# Altium footprint library aiskylab-01Resistors.PcbLib: 208 footprints (part 6 of 13)
Each footprint in its own frame and in the unit in brackets; x right, y up, seen from the top. Pads: shape width x height; smd on the part's side, far side on the other; paste and mask are expansions set on the pad; w line width, h text height; cw(c..) or ccw(c..) is an arc to the next point about the centre after c.
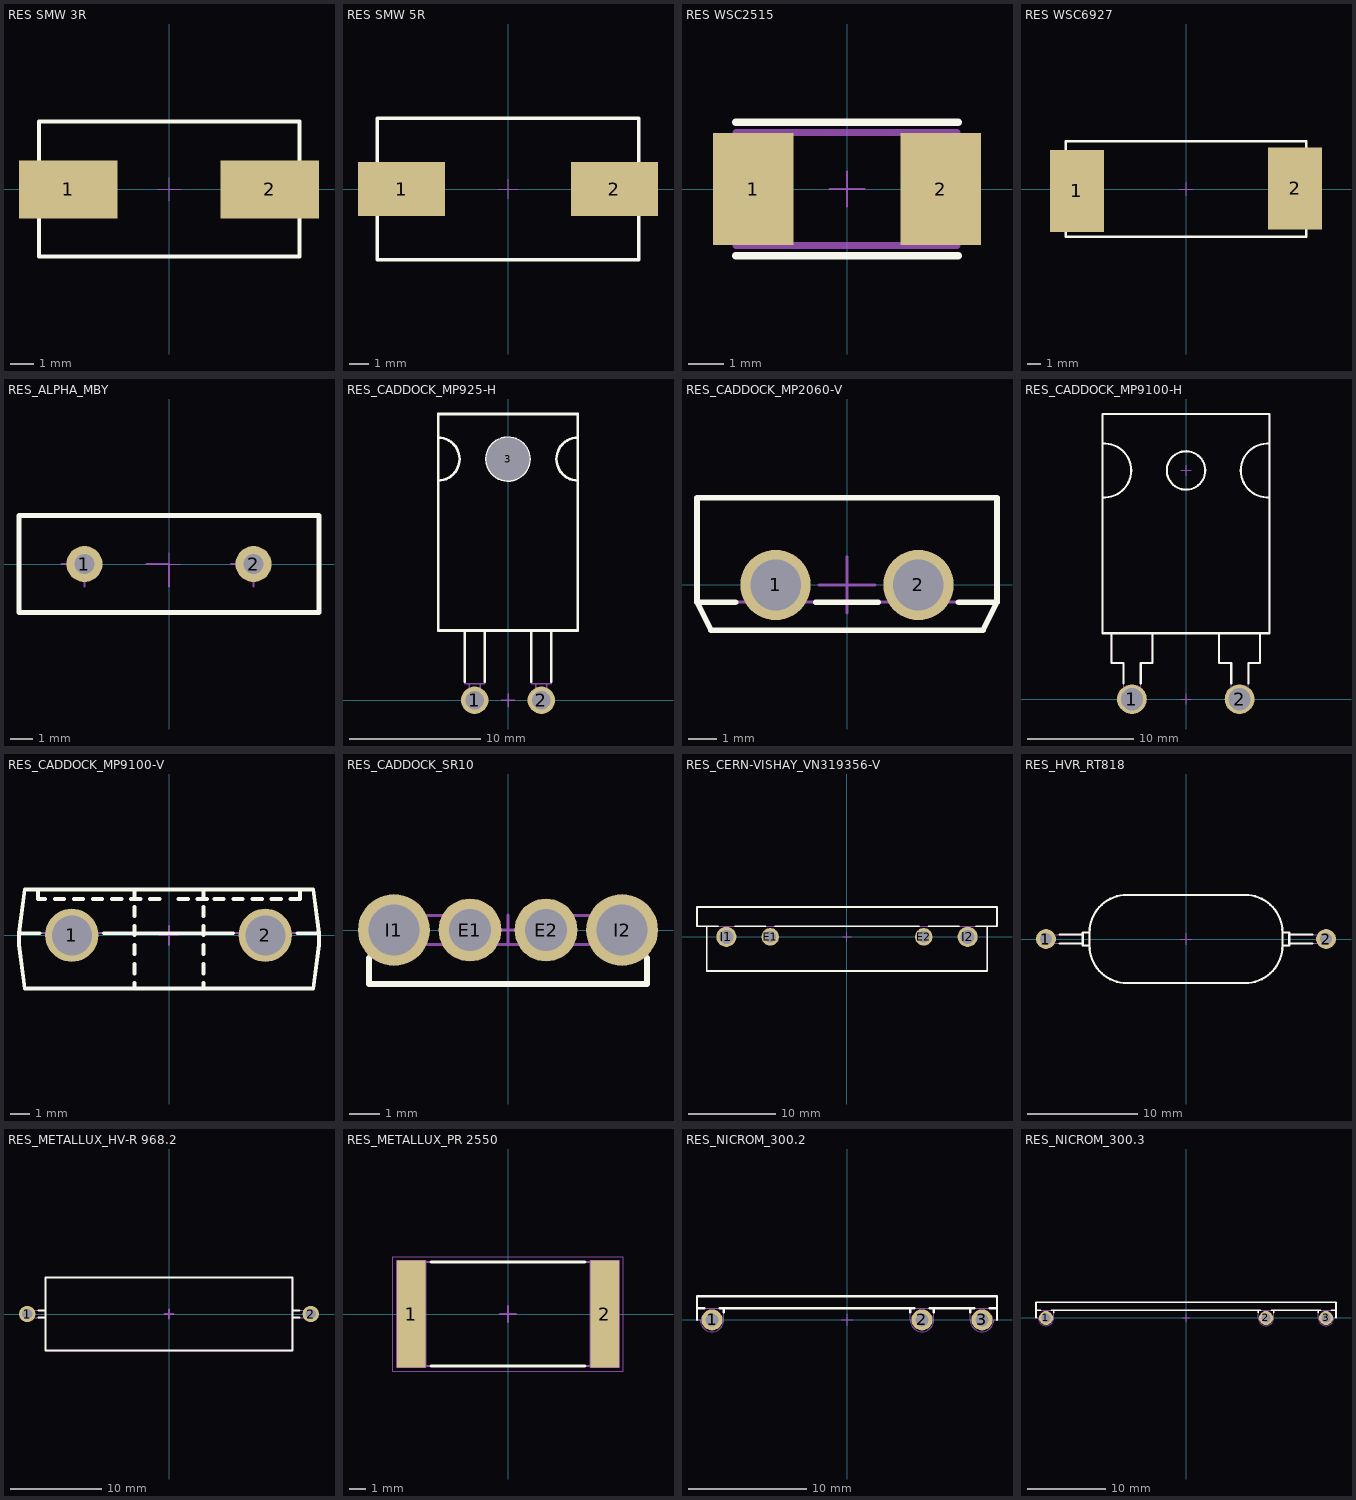
[diagram p5: the footprints below, top view; thin cyan lines are the x and y axes]

## RES SMW 3R [mm]
height 2.2
pads (2):
  rect 4.25x2.5 smd mask+0.07: 1(-4.35,0)
  rect 4.25x2.5 smd: 2(4.35,0)
Top Overlay:
  lines w0.178: -5.613,-2.896 5.626,-2.896 5.626,2.921 -5.613,2.921 -5.613,-2.896
Top Designator:
  text ".Designator" at -7.602,-0.495 h1.52
Top Component Center:
  lines w0.05: -0.5,0 0.5,0 ; 0,-0.5 0,0.5
3D body "p425-250.stp": height 0.02, standoff 0, extent -6.475,-1.25 -2.225,1.25
3D body "p425-250.stp": height 0.02, standoff 0, extent 2.225,-1.25 6.475,1.25
3D body "res-sm-3w.stp": height 5, standoff 0, extent -5.45,-2.75 5.45,2.75

## RES SMW 5R [mm]
height 2.2
pads (2):
  rect 4.5x2.8 smd: 1(-5.5,0)
  rect 4.5x2.8 smd mask+0.07: 2(5.5,0)
Top Overlay:
  lines w0.178: -6.75,-3.65 6.75,-3.65 6.75,3.65 -6.75,3.65 -6.75,-3.65
Top Designator:
  text ".Designator" at -7.633,-0.508 h1.52
Top Component Center:
  lines w0.05: -0.5,0 0.5,0 ; 0,-0.5 0,0.5
3D body "p450-280.stp": height 0.02, standoff 0, extent 3.275,-1.4 7.775,1.4
3D body "p450-280.stp": height 0.02, standoff 0, extent -7.8,-1.4 -3.3,1.4
3D body "ressmw05.stp": height 6.8, standoff -0.3, extent -7.255,-3.429 7.061,3.371

## RES WSC2515 [mm]
height 2.2
pads (2):
  rect 2.29x3.2 smd: 1(-2.67,0)
  rect 2.29x3.2 smd mask+0.07: 2(2.67,0)
Top Overlay:
  lines w0.2: -3.175,-1.9 3.175,-1.9 ; -3.175,1.9 3.175,1.9
Top Designator:
  text ".Designator" at -7.633,-0.508 h1.52
Top Component Center:
  lines w0.05: -0.5,0 0.5,0 ; 0,-0.5 0,0.5
Bottom 3D Body:
  lines w0.2: -3.162,-1.613 3.137,-1.613 3.137,1.613 -3.162,1.613 -3.162,-1.613
3D body "2_92-2_29.stp": height 0.02, standoff 0, extent 1.522,-1.333 3.812,1.587
3D body "2_92-2_29.stp": height 0.02, standoff 0, extent -3.812,-1.32 -1.522,1.6
3D body "2_92-2_29.stp": height 0.02, standoff 0, extent 1.522,-1.612 3.812,1.308
3D body "2_92-2_29.stp": height 0.02, standoff 0, extent -3.825,-1.6 -1.535,1.321
3D body "res6332_2515.stp": height 0.6, standoff 0, extent -3.15,-1.613 3.15,1.587

## RES WSC6927 [mm]
height 2.2
pads (2):
  rect 3.94x5.97 smd: 1(-7.94,-0.14)
  rect 3.94x5.97 smd mask+0.07: 2(7.94,0.038)
Top Overlay:
  lines w0.178: -8.765,-3.49 8.765,-3.49 8.765,3.49 -8.765,3.49 -8.765,-3.49
Top Designator:
  text ".Designator" at -7.633,-0.508 h1.52
Top Component Center:
  lines w0.05: -0.5,0 0.5,0 ; 0,-0.5 0,0.5
3D body "p597-394.stp": height 0.02, standoff 0, extent 5.98,-2.935 9.92,3.035
3D body "p597-394.stp": height 0.02, standoff 0, extent -9.895,-3.135 -5.955,2.835

## RES_ALPHA_MBY [mm] "Resistor, Radial, Pad spacing 7.5mm - Body 13.3mm X 4.3mm X 10.3mm H"
height 10.3
pads (2):
  round 1.6 hole 0.9: 1(-3.75,0) 2(3.75,0)
Top Overlay:
  lines w0.2: -6.65,-2.15 6.65,-2.15 6.65,2.15 -6.65,2.15 -6.65,-2.15
Top Designator:
  text ".Designator" at -7.618,-0.508 h1.52
Top Component Center:
  lines w0.05: -0.5,0 0.5,0 ; 0,-0.5 0,0.5
Top Dimensions:
  lines w0.1: -4.75,0 -3.75,0 -3.75,-1 ; -1,0 0,0 0,-1 ; 2.75,0 3.75,0 3.75,-1
Top 3D Body:
  lines w0.1: -6.65,-2.15 -6.65,2.15 6.65,2.15 6.65,-2.15 -6.65,-2.15
3D body "v160-090.stp": height 0.02, standoff -1.65, extent 2.95,-0.8 4.55,0.8
3D body "v160-090.stp": height 0.02, standoff -1.65, extent -4.55,-0.8 -2.95,0.8
3D body "RES_ALPHA_MBY.stp": height 10.3, standoff -3.1, extent -6.65,-2.15 6.65,2.15

## RES_CADDOCK_MP925-H [mm] "CADDOCK MP925 Serie TO-220 Style, Power Film Resistors"
height 3.44
pads (3):
  round 2.1 hole 1.4: 1(-2.54,0) 2(2.54,0)
  round 1 hole 3.3 unplated: 3(0,18.4)
Top Overlay:
  circle w0.2: c0,18.4 r1.64
  lines w0.2: -5.335,16.76 ccw(c-5.335,18.4) -5.335,20.04 ; -3.305,1.4 -3.305,5.32 -1.775,5.32 -1.775,1.4 ; -0.765,5.32 0.765,5.32 ; 1.775,1.4 1.775,5.32 3.305,5.32 3.305,1.4 ; 5.335,16.76 cw(c5.335,18.4) 5.335,20.04 ; -5.335,5.32 5.335,5.32 5.335,21.84 -5.335,21.84 -5.335,5.32
Top Designator:
  text ".Designator" at -7.618,9.886 h1.52
Top Assembly:
  lines w0.1: -2.97,1.26 -2.97,-0.37 -2.11,-0.37 -2.11,1.26 ; -0.765,5.32 0.765,5.32 ; 2.11,1.26 2.11,-0.37 2.97,-0.37 2.97,1.26 ; -5.335,5.32 -5.335,21.84 5.335,21.84 5.335,5.32 -5.335,5.32 ; -3.305,1.26 -3.305,5.32 -1.775,5.32 -1.775,1.26 -3.305,1.26 ; 1.775,1.26 1.775,5.32 3.305,5.32 3.305,1.26 1.775,1.26
Top Component Center:
  lines w0.1: -3.04,0 -2.54,0 ; -2.54,-0.5 -2.54,0 ; -2.54,0.5 -2.54,0 ; -2.04,0 -2.54,0 ; -0.5,0 0,0 ; -0.5,18.4 0,18.4 ; 0,-0.5 0,0 ; 0,0.5 0,0 ; 0,17.9 0,18.4 ; 0,18.9 0,18.4 ; 0.5,0 0,0 ; 0.5,18.4 0,18.4 ; 2.04,0 2.54,0 ; 2.54,-0.5 2.54,0 ; 2.54,0.5 2.54,0 ; 3.04,0 2.54,0
3D body "RES_CADDOCK_MP925_H.stp": height 3.44, standoff -3.6, extent -5.335,-0.37 5.335,21.84
3D body "v200-130.stp": height 0.02, standoff -1.65, extent 1.54,-1 3.54,1
3D body "v200-130.stp": height 0.02, standoff -1.65, extent -3.55,-1.075 -1.55,0.925

## RES_CADDOCK_MP2060-V [mm] "CADDOCK MP3060 Serie, Radial Power Clip Mount Resistor, Pad spacing 5.08mm"
height 21.09
pads (2):
  round 2.5 hole 1.8: 1(-2.54,0) 2(2.54,0)
Top Overlay:
  lines w0.2: -3.965,-0.61 -5.335,-0.61 ; -1.115,-0.61 1.115,-0.61 ; 3.965,-0.61 5.335,-0.61 ; -5.335,-0.61 -4.835,-1.61 4.835,-1.61 5.335,-0.61 ; -5.335,-0.61 -5.335,3.1 5.335,3.1 5.335,-0.61
Top Designator:
  text ".Designator" at -7.618,0.237 h1.52
Top Component Center:
  lines w0.05: -0.5,0 0.5,0 ; 0,-0.5 0,0.5
Top Dimensions:
  lines w0.1: -3.54,0 -2.54,0 ; -2.54,-1 -2.54,0 ; -2.54,1 -2.54,0 ; -1.54,0 -2.54,0 ; -1,0 0,0 ; 0,-1 0,0 ; 0,1 0,0 ; 1,0 0,0 ; 1.54,0 2.54,0 ; 2.54,-1 2.54,0 ; 2.54,1 2.54,0 ; 3.54,0 2.54,0
Top 3D Body:
  lines w0.1: -5.335,-0.61 -4.835,-1.61 4.835,-1.61 5.335,-0.61 ; -5.335,-0.61 -5.335,3.1 5.335,3.1 5.335,-0.61 ; -5.335,-0.61 5.335,-0.61
3D body "v200-130.stp": height 0.02, standoff -1.65, extent 1.54,-1 3.54,1
3D body "v200-130.stp": height 0.02, standoff -1.65, extent -3.54,-1 -1.54,1
3D body "RES_CADDOCK_MP2060.stp": height 21.72, standoff -3.4, extent -5.335,-1.61 5.335,3.1

## RES_CADDOCK_MP9100-H [mm] "CADDOCK MP9100 Serie TO-247 Style, Power Film Resistors"
height 5.21
pads (2):
  round 2.8 hole 2.1: 1(-5.105,0) 2(5.055,0)
Top Overlay:
  circle w0.2: c0,21.59 r1.815
  lines w0.2: -7.875,19.055 ccw(c-7.71,21.59) -7.875,24.125 ; -7.035,6.22 -7.035,3.43 -5.89,3.43 -5.89,1.5 ; -4.27,1.5 -4.27,3.43 -3.175,3.43 -3.175,6.22 ; 3.125,6.22 3.125,3.43 4.27,3.43 4.27,1.5 ; 5.89,1.5 5.89,3.43 6.985,3.43 6.985,6.22 ; 7.875,19.055 cw(c7.71,21.59) 7.875,24.125 ; -7.875,6.22 7.875,6.22 7.875,26.92 -7.875,26.92 -7.875,6.22
Top Designator:
  text ".Designator" at -7.618,12.251 h1.52
Bottom Designator:
  lines w0.1: -5.89,-0.455 -4.27,-0.455 ; 4.27,-0.455 5.89,-0.455
Top Component Center:
  lines w0.05: -0.5,0 0.5,0 ; 0,-0.5 0,0.5
  lines w0.1: -5.58,0 -5.08,0 ; -5.08,-0.5 -5.08,0 ; -5.08,0.5 -5.08,0 ; -4.58,0 -5.08,0 ; -0.5,0 0,0 ; -0.5,21.59 0,21.59 ; 0,-0.5 0,0 ; 0,0.5 0,0 ; 0,21.09 0,21.59 ; 0,22.09 0,21.59 ; 0.5,0 0,0 ; 0.5,21.59 0,21.59 ; 4.58,0 5.08,0 ; 5.08,-0.5 5.08,0 ; 5.08,0.5 5.08,0 ; 5.58,0 5.08,0
Top 3D Body:
  circle w0.1: c0,21.59 r1.815
  lines w0.1: -7.875,19.055 ccw(c-7.71,21.59) -7.875,24.125 ; -7.035,6.22 -7.035,3.43 -5.89,3.43 -5.89,-0.455 ; -4.27,-0.455 -4.27,3.43 -3.175,3.43 -3.175,6.22 ; 3.125,6.22 3.125,3.43 4.27,3.43 4.27,-0.455 ; 5.89,-0.455 5.89,3.43 6.985,3.43 6.985,6.22 ; 7.875,19.055 cw(c7.71,21.59) 7.875,24.125 ; -7.875,6.22 7.875,6.22 7.875,26.92 -7.875,26.92 -7.875,6.22
3D body "v200-130.stp": height 0.02, standoff -1.65, extent -6.105,-1 -4.105,1
3D body "v200-130.stp": height 0.02, standoff -1.65, extent 4.055,-1 6.055,1
3D body "RES_CADDOCK_MP9100_H.stp": height 5.21, standoff -3.8, extent -7.875,-0.455 7.875,26.92

## RES_CADDOCK_MP9100-V [mm] "CADDOCK MP9100 Serie TO-247 Style, Power Film Resistors"
height 27.3
pads (2):
  round 2.8 hole 2.1: 1(-5.105,0) 2(5.055,0)
Top Overlay:
  lines w0.2: -6.875,2.41 -6.875,1.91 -6.5,1.91 ; -6.801,0.11 -7.875,0.11 ; -6,1.91 -5.5,1.91 ; -5,1.91 -4.5,1.91 ; -4,1.91 -3.5,1.91 ; -3.409,0.11 3.359,0.11 ; -3,1.91 -2.5,1.91 ; -2,1.91 -1.5,1.91 ; -1.815,-2.8 -1.815,-2.5 ; -1.815,-2 -1.815,-1.5 ; -1.815,-1 -1.815,-0.5 ; -1.815,0 -1.815,0.5 ; -1.815,1 -1.815,1.5 ; -1.815,2 -1.815,2.41 ; -1,1.91 -0.5,1.91 ; 0.5,1.91 1,1.91 ; 1.5,1.91 2,1.91 ; 1.815,-2.8 1.815,-2.5 ; 1.815,-2 1.815,-1.5 ; 1.815,-1 1.815,-0.5 ; 1.815,0 1.815,0.5 ; 1.815,1 1.815,1.5 ; 1.815,2 1.815,2.41 ; 2.375,1.91 2.875,1.91 ; 3.375,1.91 3.875,1.91 ; 4.375,1.91 4.875,1.91 ; 5.375,1.91 5.875,1.91 ; 6.375,1.91 6.875,1.91 6.875,2.41 ; 6.751,0.11 7.875,0.11 ; -7.875,0.11 -7.575,2.41 7.575,2.41 7.875,0.11 ; -7.875,0.11 -7.875,-0.5 -7.575,-2.8 7.575,-2.8 7.875,-0.5 7.875,0.11
Top Designator:
  text ".Designator" at -7.618,-0.703 h1.52
Top Assembly:
  lines w0.1: -6.875,2.41 -6.875,1.91 -6.5,1.91 ; -6,1.91 -5.5,1.91 ; -5,1.91 -4.5,1.91 ; -4,1.91 -3.5,1.91 ; -3,1.91 -2.5,1.91 ; -2,1.91 -1.5,1.91 ; -1.815,-2.8 -1.815,-2.5 ; -1.815,-2 -1.815,-1.5 ; -1.815,-1 -1.815,-0.5 ; -1.815,0 -1.815,0.5 ; -1.815,1 -1.815,1.5 ; -1.815,2 -1.815,2.41 ; -1,1.91 -0.5,1.91 ; 0.5,1.91 1,1.91 ; 1.5,1.91 2,1.91 ; 1.815,-2.8 1.815,-2.5 ; 1.815,-2 1.815,-1.5 ; 1.815,-1 1.815,-0.5 ; 1.815,0 1.815,0.5 ; 1.815,1 1.815,1.5 ; 1.815,2 1.815,2.41 ; 2.375,1.91 2.875,1.91 ; 3.375,1.91 3.875,1.91 ; 4.375,1.91 4.875,1.91 ; 5.375,1.91 5.875,1.91 ; 6.375,1.91 6.875,1.91 6.875,2.41 ; -7.875,0.11 7.875,0.11 ; -7.875,0.11 -7.575,2.41 7.575,2.41 7.875,0.11 ; -7.875,0.11 -7.875,-0.5 -7.575,-2.8 7.575,-2.8 7.875,-0.5 7.875,0.11
Top Component Center:
  lines w0.1: -5.605,0 -5.105,0 ; -5.105,-0.5 -5.105,0 ; -5.105,0.5 -5.105,0 ; -4.605,0 -5.105,0 ; -0.5,0 0,0 ; 0,-0.5 0,0 ; 0,0.5 0,0 ; 0.5,0 0,0 ; 4.555,0 5.055,0 ; 5.055,-0.5 5.055,0 ; 5.055,0.5 5.055,0 ; 5.555,0 5.055,0
3D body "v200-130.stp": height 0.02, standoff -1.65, extent 4.055,-1 6.055,1
3D body "RES_CADDOCK_MP9100_V.stp": height 27.33, standoff -3.8, extent -7.875,-2.8 7.875,2.41
3D body "v200-130.stp": height 0.02, standoff -1.65, extent -6.105,-1 -4.105,1
3D body "v200-130.stp": height 0.02, standoff -1.65, extent 4.055,-1 6.055,1

## RES_CADDOCK_SR10 [mm] "Precision Current Sense Resistor"
height 9.78
pads (4):
  round 2.1 hole 1.4: E1(-1.27,0) E2(1.27,0)
  round 2.4 hole 1.7: I1(-3.81,0) I2(3.81,0)
Top Overlay:
  lines w0.2: -4.635,-0.939 -4.635,-1.8 4.635,-1.8 4.635,-0.939
Top Designator:
  text ".Designator" at -7.618,-0.807 h1.52
Top Assembly:
  lines w0.1: -4.38,-0.49 -4.38,0.49 -0.95,0.49 -0.95,-0.49 ; 0.95,-0.49 0.95,0.49 4.38,0.49 4.38,-0.49 ; -4.635,-1.8 4.635,-1.8 4.635,-0.49 -4.635,-0.49 -4.635,-1.8
Top Component Center:
  lines w0.1: -4.31,0 -3.81,0 ; -3.81,-0.5 -3.81,0 ; -3.81,0.5 -3.81,0 ; -3.31,0 -3.81,0 ; -1.77,0 -1.27,0 ; -1.27,-0.5 -1.27,0 ; -1.27,0.5 -1.27,0 ; -0.77,0 -1.27,0 ; -0.5,0 0,0 ; 0,-0.5 0,0 ; 0,0.5 0,0 ; 0.5,0 0,0 ; 0.77,0 1.27,0 ; 1.27,-0.5 1.27,0 ; 1.27,0.5 1.27,0 ; 1.77,0 1.27,0 ; 3.31,0 3.81,0 ; 3.81,-0.5 3.81,0 ; 3.81,0.5 3.81,0 ; 4.31,0 3.81,0
3D body "RES_CADDOCK_SR10.stp": height 9.87, standoff -3.6, extent -4.635,-1.8 4.635,0.49
3D body "v200-130.stp": height 0.02, standoff -1.65, extent 2.81,-1 4.81,1
3D body "v200-130.stp": height 0.02, standoff -1.65, extent 0.27,-1 2.27,1
3D body "v200-130.stp": height 0.02, standoff -1.65, extent -2.27,-1 -0.27,1
3D body "v200-130.stp": height 0.02, standoff -1.65, extent -4.81,-1 -2.81,1

## RES_CERN-VISHAY_VN319356-V [mm] "Custom Made Product VISHAY High Stability Precision Shunt Resistor"
height 25.2
pads (4):
  round 2 hole 1.3: E1(-8.75,0) E2(8.75,0)
  round 2.3 hole 1.6: I1(-13.75,0) I2(13.75,0)
Top Overlay:
  lines w0.2: -16,1.2 -16,-3.9 16,-3.9 16,1.2 ; -14.7,1.2 -17.1,1.2 -17.1,3.4 17.1,3.4 17.1,1.2 14.7,1.2 ; -12.8,1.2 -9.25,1.2 ; -8.25,1.2 8.25,1.2 ; 9.25,1.2 12.8,1.2
Top Designator:
  text ".Designator" at -7.617,-0.758 h1.52
Top Assembly:
  lines w0.1: -17.1,1.2 17.1,1.2 17.1,3.4 -17.1,3.4 -17.1,1.2 ; -16,-3.9 16,-3.9 16,1.2 -16,1.2 -16,-3.9
Top Component Center:
  lines w0.1: -14.25,0 -13.75,0 ; -13.75,-0.5 -13.75,0 ; -13.75,0.5 -13.75,0 ; -13.25,0 -13.75,0 ; -9.25,0 -8.75,0 ; -8.75,-0.5 -8.75,0 ; -8.75,0.5 -8.75,0 ; -8.25,0 -8.75,0 ; -0.5,0 0,0 ; 0,-0.5 0,0 ; 0,0.5 0,0 ; 0.5,0 0,0 ; 8.25,0 8.75,0 ; 8.75,-0.5 8.75,0 ; 8.75,0.5 8.75,0 ; 9.25,0 8.75,0 ; 13.25,0 13.75,0 ; 13.75,-0.5 13.75,0 ; 13.75,0.5 13.75,0 ; 14.25,0 13.75,0
3D body "RES_CERN-VISHAY_VN319356-v.stp": height 25.2, standoff -3.8, extent -17.1,-3.9 17.1,3.4
3D body "v200-130.stp": height 0.02, standoff -1.65, extent -14.75,-1 -12.75,1
3D body "v200-130.stp": height 0.02, standoff -1.65, extent -9.75,-1 -7.75,1
3D body "v200-130.stp": height 0.02, standoff -1.65, extent 7.75,-1 9.75,1
3D body "v200-130.stp": height 0.02, standoff -1.65, extent 12.75,-1 14.75,1

## RES_HVR_RT818 [mm] "Resistor, Axial, Pad spacing 25.4mm - Body L 18.5mm X D 8mm Lead Diameter 0.812mm"
height 8
pads (2):
  round 1.8 hole 1.1: 1(-12.7,0) 2(12.7,0)
Top Overlay:
  lines w0.2: -11.465,-0.406 -9.365,-0.406 ; -11.465,0.406 -9.365,0.406 ; 9.365,-0.406 11.465,-0.406 ; 9.365,0.406 11.465,0.406 ; -8.75,-0.6 ccw(c-5.35,-0.6) -5.35,-4 5.35,-4 ccw(c5.35,-0.6) 8.75,-0.6 ; -8.75,-0.6 -8.75,0.6 ; -8.75,-0.6 -9.365,-0.6 -9.365,0.6 -8.75,0.6 ; -8.75,0.6 cw(c-5.35,0.6) -5.35,4 5.35,4 cw(c5.35,0.6) 8.75,0.6 ; 8.75,-0.6 8.75,0.6 ; 8.75,-0.6 9.365,-0.6 9.365,0.6 8.75,0.6
Top Designator:
  text ".Designator" at -7.618,-0.508 h1.52
Top Assembly:
  lines w0.1: -9.365,-0.406 -12.7,-0.406 cw(c-12.7,0) -12.7,0.406 -9.365,0.406 ; 9.365,-0.406 12.7,-0.406 ccw(c12.7,0) 12.7,0.406 9.365,0.406 ; -8.75,-0.6 ccw(c-5.35,-0.6) -5.35,-4 5.35,-4 ccw(c5.35,-0.6) 8.75,-0.6 ; -8.75,-0.6 -8.75,0.6 ; -8.75,-0.6 -9.365,-0.6 -9.365,0.6 -8.75,0.6 ; -8.75,0.6 cw(c-5.35,0.6) -5.35,4 5.35,4 cw(c5.35,0.6) 8.75,0.6 ; 8.75,-0.6 8.75,0.6 ; 8.75,-0.6 9.365,-0.6 9.365,0.6 8.75,0.6
Top Component Center:
  lines w0.1: -13.2,0 -12.7,0 ; -12.7,-0.5 -12.7,0 ; -12.7,0.5 -12.7,0 ; -12.2,0 -12.7,0 ; -0.5,0 0,0 ; 0,-0.5 0,0 ; 0,0.5 0,0 ; 0.5,0 0,0 ; 12.2,0 12.7,0 ; 12.7,-0.5 12.7,0 ; 12.7,0.5 12.7,0 ; 13.2,0 12.7,0
3D body "v200-130.stp": height 0.02, standoff -1.65, extent 11.7,-1 13.7,1
3D body "v200-130.stp": height 0.02, standoff -1.65, extent -13.7,-1 -11.7,1
3D body "RES_HVR_RT818.stp": height 8, standoff -3.6, extent -13.106,-4 13.106,4

## RES_METALLUX_HV-R 968.2 [mm] "Resistor, Axial, Pad Spacing 31mm - Body Lengh 27mm X Body Diameter 8mm"
height 8
pads (2):
  round 1.8 hole 1.1: 1(-15.5,0) 2(15.5,0)
Top Overlay:
  lines w0.2: -14.275,-0.4 -13.5,-0.4 ; -14.275,0.4 -13.5,0.4 ; 13.5,-0.4 14.275,-0.4 ; 13.5,0.4 14.275,0.4 ; -13.5,-4 -13.5,4 13.5,4 13.5,-4 -13.5,-4
Top Designator:
  text ".Designator" at -7.618,-0.508 h1.52
Top Assembly:
  lines w0.1: -13.5,-0.4 -15.5,-0.4 cw(c-15.5,0) -15.5,0.4 -13.5,0.4 ; 13.5,-0.4 15.5,-0.4 ccw(c15.5,0) 15.5,0.4 13.5,0.4 ; -13.5,-4 -13.5,4 13.5,4 13.5,-4 -13.5,-4
Top Dimensions:
  lines w0.2: -16,0 -15.5,0 ; -15.5,-0.5 -15.5,0 ; -15.5,0.5 -15.5,0 ; -15,0 -15.5,0 ; -0.5,0 0,0 ; 0,-0.5 0,0 ; 0,0.5 0,0 ; 0.5,0 0,0 ; 15,0 15.5,0 ; 15.5,-0.5 15.5,0 ; 15.5,0.5 15.5,0 ; 16,0 15.5,0
3D body "RES_METALLUX_HV-R 968.2.stp": height 8, standoff -3.6, extent -15.9,-4 15.9,4
3D body "v200-130.stp": height 0.02, standoff -1.65, extent 14.5,-1 16.5,1
3D body "v200-130.stp": height 0.02, standoff -1.65, extent -16.5,-1 -14.5,1

## RES_METALLUX_PR 2550 [mm] "High Voltage Resistor SMD Resistor, 2-Leads, Body 12.7 x 6.35 mm, IPC Medium Density"
height 1.52
pads (2):
  rect 1.75x6.5 smd: 1(-5.9,0) 2(5.9,0)
Top Overlay:
  lines w0.2: -4.68,-3.175 4.68,-3.175 ; -4.68,3.175 4.68,3.175
Top Designator:
  text ".Designator" at -7.618,-0.508 h1.52
Top Assembly:
  lines w0.1: -6.35,-3.175 -6.35,3.175 ; -6.35,-3.175 -6.35,3.175 ; -6.35,-3.175 -5.08,-3.175 -5.08,3.175 -6.35,3.175 ; -6.35,-3.175 6.35,-3.175 ; -6.35,3.175 6.35,3.175 ; 6.35,-3.175 6.35,3.175 ; 6.35,-3.175 6.35,3.175 ; 6.35,-3.175 5.08,-3.175 5.08,3.175 6.35,3.175
Top Dimensions:
  lines w0.1: -6.4,0 -5.9,0 ; -5.9,-0.5 -5.9,0 ; -5.9,0.5 -5.9,0 ; -5.4,0 -5.9,0 ; -0.5,0 0,0 ; 0,-0.5 0,0 ; 0,0.5 0,0 ; 0.5,0 0,0 ; 5.4,0 5.9,0 ; 5.9,-0.5 5.9,0 ; 5.9,0.5 5.9,0 ; 6.4,0 5.9,0 ; -6.775,-3.25 -5.025,-3.25 -5.025,3.25 -6.775,3.25 -6.775,-3.25 ; 5.025,-3.25 6.775,-3.25 6.775,3.25 5.025,3.25 5.025,-3.25
Bottom 3D Body:
  lines w0.05: -7.025,-3.5 -7.025,3.5 7.025,3.5 7.025,-3.5 -7.025,-3.5
3D body "RES_METALLUX_PR 2550.stp": height 1.52, standoff 0, extent -6.35,-3.175 6.35,3.175
3D body "p650-175.stp": height 0.02, standoff 0, extent -6.8,-3.25 -5.05,3.25
3D body "p650-175.stp": height 0.02, standoff 0, extent 5.05,-3.25 6.8,3.25

## RES_NICROM_300.2 [mm] "High Voltage Divider NICROM 300.2"
height 7.62
pads (3):
  round 1.8 hole 1.1: 1(-11.43,0) 2(6.35,0) 3(11.43,0)
Top Overlay:
  lines w0.2: -12.7,0 -12.7,1 ; -12.093,1 -12.7,1 ; -10.767,1 5.687,1 ; -10.43,0.663 -10.43,1 ; 5.35,0.663 5.35,1 ; 7.013,1 10.767,1 ; 7.35,0.663 7.35,1 ; 10.43,0.663 10.43,1 ; 12.093,1 12.7,1 ; 12.7,0 12.7,1 ; -12.7,1 -12.7,2 ; -12.7,1 -12.7,2 ; -12.7,2 12.7,2 12.7,1
Top Designator:
  text ".Designator" at -7.618,0.017 h1.52
Top Assembly:
  lines w0.1: -10.43,1 -10.43,0 cw(c-11.43,0) -12.43,0 ; 5.35,1 5.35,0 ccw(c6.35,0) 7.35,0 7.35,1 ; 10.43,1 10.43,0 ccw(c11.43,0) 12.43,0 12.7,0 12.7,1 ; -12.7,0 -12.43,0 ; -12.7,0 -12.7,1 ; -12.7,0 -12.43,0 ; -12.7,1 -12.7,2 12.7,2 12.7,1 ; -12.7,1 12.7,1
Top Dimensions:
  lines w0.1: -11.93,0 -11.43,0 ; -11.43,-0.5 -11.43,0 ; -11.43,0.5 -11.43,0 ; -10.93,0 -11.43,0 ; -0.5,0 0,0 ; 0,-0.5 0,0 ; 0,0.5 0,0 ; 0.5,0 0,0 ; 5.85,0 6.35,0 ; 6.35,-0.5 6.35,0 ; 6.35,0.5 6.35,0 ; 6.85,0 6.35,0 ; 10.93,0 11.43,0 ; 11.43,-0.5 11.43,0 ; 11.43,0.5 11.43,0 ; 11.93,0 11.43,0
3D body "v200-130.stp": height 0.02, standoff -1.65, extent -12.43,-1 -10.43,1
3D body "v200-130.stp": height 0.02, standoff -1.65, extent 10.43,-1 12.43,1
3D body "v200-130.stp": height 0.02, standoff -1.65, extent 5.35,-1 7.35,1
3D body "RES_NICROM_300.2.stp": height 12.62, standoff -3.6, extent -12.7,-1 12.7,2

## RES_NICROM_300.3 [mm] "High Voltage Divider NICROM 300.3"
height 12.7
pads (3):
  round 1.8 hole 1.1: 1(-17.78,0) 2(10.16,0) 3(17.78,0)
Top Overlay:
  lines w0.2: -19.05,0 -19.05,1 ; -18.443,1 -19.05,1 ; -17.117,1 9.497,1 ; -16.78,0.663 -16.78,1 ; 9.16,0.663 9.16,1 ; 10.823,1 17.117,1 ; 11.16,0.663 11.16,1 ; 16.78,0.663 16.78,1 ; 18.443,1 19.05,1 ; 19.05,0 19.05,1 ; -19.05,1 -19.05,2 ; -19.05,1 -19.05,2 ; -19.05,2 19.05,2 19.05,1
Top Designator:
  text ".Designator" at -7.618,0.017 h1.52
Top Assembly:
  lines w0.1: -16.78,1 -16.78,0 cw(c-17.78,0) -18.78,0 ; 9.16,1 9.16,0 ccw(c10.16,0) 11.16,0 11.16,1 ; 16.78,1 16.78,0 ccw(c17.78,0) 18.78,0 19.05,0 19.05,1 ; -19.05,0 -18.78,0 ; -19.05,0 -19.05,1 ; -19.05,0 -18.78,0 ; -19.05,1 -19.05,2 ; -19.05,1 -19.05,2 ; -19.05,1 19.05,1 ; -19.05,2 19.05,2 ; 19.05,1 19.05,2 ; 19.05,1 19.05,2
Top Dimensions:
  lines w0.1: -18.28,0 -17.78,0 ; -17.78,-0.5 -17.78,0 ; -17.78,0.5 -17.78,0 ; -17.28,0 -17.78,0 ; -0.5,0 0,0 ; 0,-0.5 0,0 ; 0,0.5 0,0 ; 0.5,0 0,0 ; 9.66,0 10.16,0 ; 10.16,-0.5 10.16,0 ; 10.16,0.5 10.16,0 ; 10.66,0 10.16,0 ; 17.28,0 17.78,0 ; 17.78,-0.5 17.78,0 ; 17.78,0.5 17.78,0 ; 18.28,0 17.78,0
3D body "v200-130.stp": height 0.02, standoff -1.65, extent 9.16,-1 11.16,1
3D body "v200-130.stp": height 0.02, standoff -1.65, extent 16.78,-1 18.78,1
3D body "v200-130.stp": height 0.02, standoff -1.65, extent -18.78,-1 -16.78,1
3D body "RES_NICROM_300.3.stp": height 17.7, standoff -3.6, extent -19.05,-1 19.05,2